# Altium footprint library Connector.PcbLib: 230 footprints (part 2 of 15)
Each footprint in its own frame and in the unit in brackets; x right, y up, seen from the top. Pads: shape width x height; smd on the part's side, far side on the other; paste and mask are expansions set on the pad; w line width, h text height; cw(c..) or ccw(c..) is an arc to the next point about the centre after c.
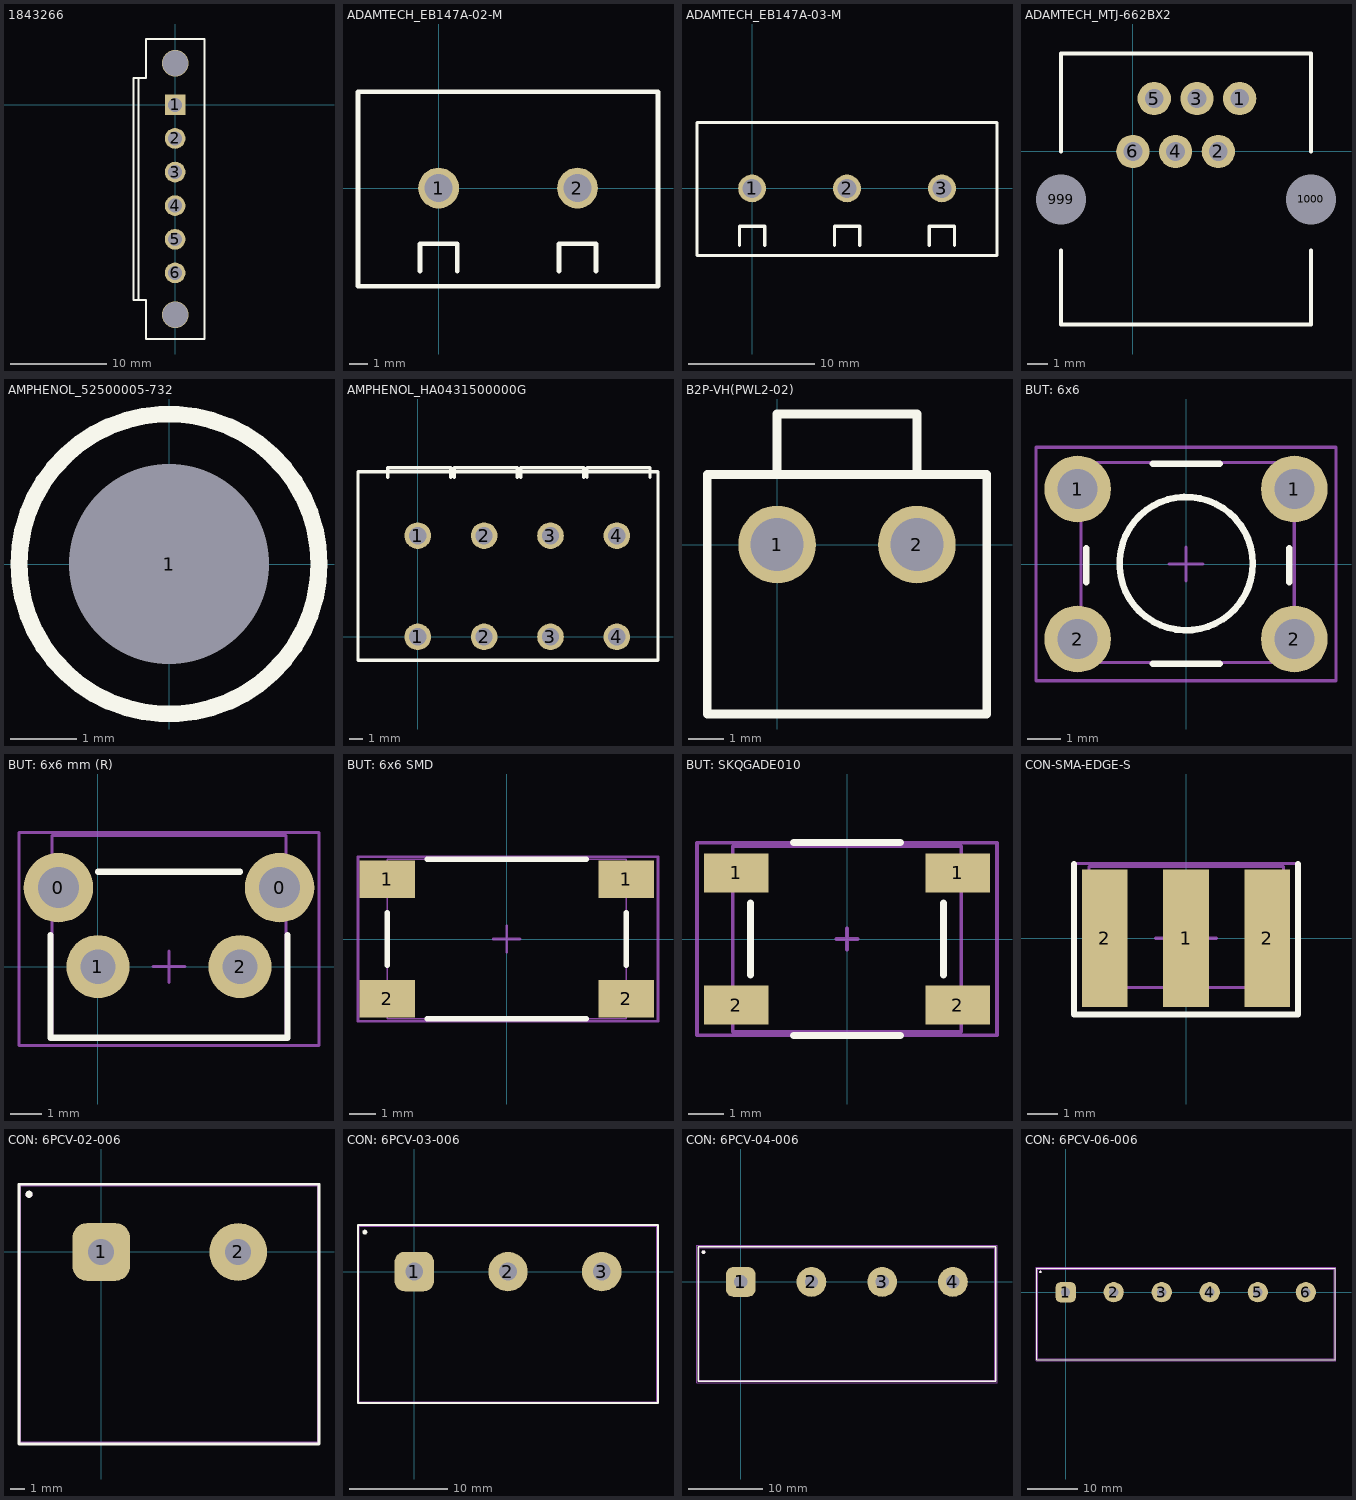
[diagram p1: the footprints below, top view; thin cyan lines are the x and y axes]

## 1843266 [mm]
pads (6):
  rect 2.15x2.15 hole 1.45: 1(0,0)
  round 2.15 hole 1.45: 2(0,-3.5) 3(0,-7) 4(0,-10.5) 5(0,-14) 6(0,-17.5)
via 0,4.318 diameter 2.75 hole 2.65
via 0,-21.844 diameter 2.75 hole 2.65
Top Overlay:
  lines w0.2: -3.81,-20.32 -3.81,2.794 ; -4.318,-20.32 -4.318,2.794 -3.048,2.794 -3.048,6.858 0,6.858 3.048,6.858 3.048,-21.844 3.048,-24.384 -3.048,-24.384 -3.048,-20.32 -4.318,-20.32
3D body: height 9.2, standoff 0, extent -4.318,-24.384 3.048,6.858

## ADAMTECH_EB147A-02-M [mm] "EURO BLOCK, 2 POSITION"
pads (2):
  round 2.2 hole 1.5: 1(0,0) 2(7.5,0)
Top Overlay:
  lines w0.254: -1,-4.5 -1,-3 1,-3 1,-4.5 ; 6.5,-4.5 6.5,-3 8.5,-3 8.5,-4.5 ; 11.85,0 11.85,-5.3 ; 11.85,-5.3 11.85,5.2 ; 11.85,-5.3 -4.354,-5.3 -4.354,5.2 11.85,5.2 ; 11.85,-5.3 11.85,5.2
3D body: height 15, standoff 0, extent -4.35,-5.292 11.85,1.725
3D body: height 11, standoff 0, extent -4.35,-5.275 11.85,5.192

## ADAMTECH_EB147A-03-M [mm] "EURO BLOCK, 3 POSITION"
pads (3):
  round 2.2 hole 1.5: 1(0,0) 2(7.5,0) 3(15,0)
Top Overlay:
  lines w0.254: -1,-4.5 -1,-3 1,-3 1,-4.5 ; 6.5,-4.5 6.5,-3 8.5,-3 8.5,-4.5 ; 14,-4.5 14,-3 16,-3 16,-4.5 ; -4.354,-5.3 19.35,-5.3 19.35,5.2 -4.354,5.2 -4.354,-5.3
3D body "17687.stp": height 13.55, standoff -4.05, extent -3.732,-4.496 18.768,4.504

## ADAMTECH_MTJ-662BX2 [mm] "CONN MOD JACK 6P6C R/A UNSHLD"
pads (8):
  round 1.6 hole 0.9: 1(5.125,2.54) 2(4.1,0) 3(3.075,2.54) 4(2.05,0) 5(1.025,2.54) 6(0,0)
  round 1.6 hole 2.4: 999(-3.45,-2.3) 1000(8.55,-2.3)
Top Overlay:
  lines w0.2: -3.45,-4.75 -3.45,-8.3 8.55,-8.3 8.55,-4.75 ; -3.45,0 -3.45,4.7 8.55,4.7 8.55,0
3D body: height 9.5, standoff 1, extent -2.3,-8.35 7.7,-5.65
3D body: height 1.5, standoff -3.5, extent 7.31,-3.547 9.8,-1.052
3D body: height 1.5, standoff -3.5, extent -4.69,-3.547 -2.2,-1.052
3D body: height 14.5, standoff 0, extent -3.45,-8.3 8.55,4.7

## AMPHENOL_52500005-732 [mm] "M2.5X0.45X8MM PANHEAD BLK"
pads (1):
  round 1.94 hole 3 unplated: 1(0,0)
Top Overlay:
  circle w0.254: c0,0 r2.25
3D body: height 4, standoff 0, extent 0,0 0,0
3D body: height 1.7, standoff 0, extent -2.25,-2.246 2.25,2.247
3D body: height 0, standoff -8, extent -1.245,-1.247 1.245,1.248

## AMPHENOL_HA0431500000G [mm] "TERM BLK 4POS SIDE ENTRY 5MM PCB"
pads (8):
  round 2 hole 1.3: 1(0,0) 1(0,7.62) 2(5,0) 2(5,7.62) 3(10,0) 3(10,7.62) 4(15,0) 4(15,7.62)
Top Overlay:
  lines w0.254: -2.25,12 -2.25,12.75 2.5,12.75 2.5,12 ; 2.75,12 2.75,12.75 7.5,12.75 7.5,12 ; 7.75,12 7.75,12.75 12.5,12.75 12.5,12 ; 12.75,12 12.75,12.75 17.5,12.75 17.5,12 ; -4.5,-1.778 -4.5,12.446 18.1,12.446 18.1,-1.778 -4.5,-1.778
3D body: height 13.3, standoff 10.4, extent 12.746,-0.694 17.496,12.75
3D body: height 13.3, standoff 10.4, extent 7.746,-0.694 12.496,12.75
3D body: height 13.3, standoff 10.4, extent -2.254,-0.694 2.496,12.75
3D body: height 13.3, standoff 10.4, extent 2.746,-0.694 7.496,12.75
3D body: height 10.4, standoff 0, extent -4.4,-1.55 18.1,12.2

## B2P-VH(PWL2-02) [mm]
pads (2):
  round 2.2 hole 1.5: 1(0,0) 2(3.96,0)
Top Overlay:
  lines w0.254: 0,1.98 0,3.7 3.96,3.7 3.96,1.98 ; -1.98,-4.8 5.94,-4.8 5.94,1.98 -1.98,1.98 -1.98,-4.8

## BUT: 6x6 [mm] "Leaded Tactile Button 6x6"
height 5
pads (4):
  round 2 hole 1.2: 1(-3.25,2.25) 1(3.25,2.25) 2(-3.25,-2.25) 2(3.25,-2.25)
Top Overlay:
  circle w0.2: c0.004,0.012 r2
  lines w0.2: -2.996,-0.544 -2.996,0.472 ; -0.996,-2.988 1.004,-2.988 ; -0.996,3.012 1.004,3.012 ; 3.1,-0.544 3.1,0.472
TopAssy:
  lines w0.1: -3.148,-2.957 3.252,-2.957 3.252,3.043 -3.148,3.043 -3.148,-2.957
Border (Mech15):
  lines w0.1: -0.5,0 0.5,0 ; 0,-0.5 0,0.5 ; -4.5,-3.5 -4.5,3.5 4.5,3.5 4.5,-3.5 -4.5,-3.5
3D body "кнопка_тактовая_6х6х1.STEP": height 4.5, standoff -0.9, extent -3.148,-2.957 3.252,3.043

## BUT: 6x6 mm (R) [mm]
height 7.4
pads (4):
  round 2.2 hole 1.3: 0(-1.25,2.5) 0(5.75,2.5)
  round 2 hole 1.1: 1(0,0) 2(4.5,0)
Top Overlay:
  lines w0.2: -1.5,1 -1.5,-2.25 6,-2.25 6,1 ; 0,3 4.5,3
TopAssy:
  lines w0.1: -1.45,-2.3 5.95,-2.3 5.95,4.15 -1.45,4.15 -1.45,-2.3
Border (Mech15):
  lines w0.1: 1.75,0 2.25,0 ; 2.25,-0.5 2.25,0 ; 2.25,0.5 2.25,0 ; 2.75,0 2.25,0 ; -2.5,-2.5 7,-2.5 7,4.25 -2.5,4.25 -2.5,-2.5
3D body "User Library-SWITCH, TACTILE, RIGHT ANGLE, 12VDC, 50MA, 6_85MM ACTUATOR, WEALTH METAL TC-0244Z-1.STEP": height 7, standoff -4, extent -1.45,-6.85 5.95,4.15

## BUT: 6x6 SMD [mm] "Leaded Tactile Button 6x6"
height 9
pads (4):
  rect 2.1x1.4 smd: 1(-4.5,2.25) 1(4.5,2.25) 2(-4.5,-2.25) 2(4.5,-2.25)
Top Overlay:
  lines w0.2: -4.5,-1 -4.5,1 ; -3,-3 3,-3 ; -3,3 3,3 ; 4.5,-1 4.5,1
TopAssy:
  lines w0.05: -4.5,-3 -4.5,3 4.5,3 4.5,-3 -4.5,-3
Border (Mech15):
  lines w0.1: -0.5,0 0.5,0 ; 0,-0.5 0,0.5 ; -5.6,-3.1 5.7,-3.1 5.7,3.1 -5.6,3.1 -5.6,-3.1
3D body "User Library-PTS645SL43SMTR92-LFS.STEP": height 4.3, standoff 0, extent -4.5,-3 4.5,3

## BUT: SKQGADE010 [mm]
pads (4):
  rect 1.8x1.1 smd: 1(-3.1,1.85) 1(3.1,1.85) 2(-3.1,-1.85) 2(3.1,-1.85)
Top Overlay:
  lines w0.2: -2.7,-1 -2.7,1 ; -1.5,-2.7 1.5,-2.7 ; -1.5,2.7 1.5,2.7 ; 2.7,-1 2.7,1
TopAssy:
  lines w0.1: -3.2,-2.6 3.2,-2.6 3.2,2.6 -3.2,2.6 -3.2,-2.6
Border (Mech15):
  lines w0.1: -0.3,0 0.3,0 ; 0,-0.3 0,0.3 ; -4.2,-2.7 4.2,-2.7 4.2,2.7 -4.2,2.7 -4.2,-2.7
3D body "User Library-4x4_SMD_Switch.STEP": height 1.45, standoff -0.05, extent -3.2,-2.6 3.2,2.6

## CON-SMA-EDGE-S [mm] "CONN SMA JACK STR EDGE MNT"
pads (3):
  rect 1.5x4.5 smd: 1(0,0) 2(-2.667,0) 2(2.667,0)
Top Overlay:
  lines w0.2: -3.675,2.425 -3.675,-2.5 3.675,-2.5 3.675,2.425
TopAssy:
  lines w0.1: -3.175,-1.6 -3.175,2.35 3.2,2.35 3.2,-1.6 3.192,-1.608 -3.167,-1.608 -3.175,-1.6
Border:
  lines w0.1: -1,0 0,0 ; 0,-1 0,0 ; 0,1 0,0 ; 1,0 0,0 ; -3.65,-2.475 -3.65,2.45 3.675,2.45 3.675,-2.475 -3.65,-2.475
3D body "User Library-SMA-EDGE-S.STEP": height 3.62, standoff -2.73, extent -3.175,-1.61 3.175,11.72

## CON: 6PCV-02-006 [mm]
pads (4):
  rrect50% 4x4 hole 1.8: 1(0,0)
  round 4 hole 1.8: 2(9.5,0)
  round 0.5 on Mech1: ""(-5,4)
  round 0.5 on Top Overlay: ""(-5,4)
Top Overlay:
  lines w0.2: -5.7,-13.3 15.1,-13.3 15.1,4.7 -5.7,4.7 -5.7,-13.3
TopAssy:
  lines w0.1: -5.6,-13.2 15,-13.2 15,4.58 -5.6,4.58 -5.6,-13.2
  text "1" at -0.2,-3.6 h2
  text "2" at 9.2,-3.6 h2
Border:
  lines w0.1: -5.7,-13.3 15.1,-13.3 15.1,4.7 -5.7,4.7 -5.7,-13.3
3D body "02.STEP": height 15.96, standoff -4.99, extent -5.6,-13.2 15,4.58

## CON: 6PCV-03-006 [mm]
pads (4):
  rrect50% 4x4 hole 1.8: 1(0,0)
  round 4 hole 1.8: 2(9.5,0) 3(19,0)
  round 0.5 on Top Overlay: ""(-5,4)
Top Overlay:
  lines w0.2: -5.7,-13.3 -5.7,4.7 24.7,4.7 24.7,-13.3 -5.7,-13.3
TopAssy:
  lines w0.1: -5.562,-13.2 -5.562,4.58 24.562,4.58 24.562,-13.2 -5.562,-13.2
  text "1" at -0.2,-3.6 h2
  text "2" at 9.2,-3.6 h2
  text "3" at 18.8,-3.6 h2
Border:
  lines w0.1: -5.675,-13.3 24.675,-13.3 24.675,4.675 -5.675,4.675 -5.675,-13.3
3D body "03.STEP": height 15.96, standoff -4.99, extent -5.562,-13.2 24.562,4.58

## CON: 6PCV-04-006 [mm]
pads (6):
  rrect50% 4x4 hole 1.8: 1(0,0)
  round 4 hole 1.8: 2(9.5,0) 3(19,0) 4(28.5,0)
  round 0.5 on Mech1: ""(-5,4)
  round 0.5 on Top Overlay: ""(-5,4)
Top Overlay:
  lines w0.2: -5.7,-13.35 34.25,-13.35 34.25,4.725 -5.7,4.725 -5.7,-13.35
TopAssy:
  lines w0.1: -5.55,-13.2 34.1,-13.2 34.1,4.58 -5.55,4.58 -5.55,-13.2
  text "4" at 28.2,-3.6 h2
  text "3" at 18.8,-3.6 h2
  text "2" at 9.2,-3.6 h2
  text "1" at -0.2,-3.6 h2
Border:
  lines w0.1: -5.875,-13.525 -5.875,4.9 34.425,4.9 34.425,-13.525 -5.875,-13.525
3D body "6pcv-04-006.STEP": height 15.96, standoff -4.99, extent -5.525,-13.18 34.125,4.6

## CON: 6PCV-06-006 [mm]
pads (8):
  rrect50% 4x4 hole 1.8: 1(0,0)
  round 4 hole 1.8: 2(9.5,0) 3(19,0) 4(28.5,0) 5(38,0) 6(47.5,0)
  round 0.5 on Mech1: ""(-5,4)
  round 0.5 on Top Overlay: ""(-5,4)
Top Overlay:
  lines w0.2: -5.7,-13.35 -5.7,4.725 53.3,4.725 53.3,-13.35 -5.7,-13.35
TopAssy:
  lines w0.1: -5.55,-13.2 -5.55,4.58 53.15,4.58 53.15,-13.2 -5.55,-13.2
  text "1" at -0.2,-3.6 h2
  text "2" at 9.2,-3.6 h2
  text "3" at 18.8,-3.6 h2
  text "4" at 28.2,-3.6 h2
  text "5" at 37.7,-3.6 h2
  text "6" at 47.2,-3.5 h2
Border:
  lines w0.1: -5.875,-13.525 53.475,-13.525 53.475,4.9 -5.875,4.9 -5.875,-13.525
3D body "6pcv-06-006.STEP": height 15.96, standoff -4.99, extent -5.55,-13.2 53.15,4.58